# Altium footprint library hallglib.PcbLib: 90 footprints (part 4 of 6)
Each footprint in its own frame and in the unit in brackets; x right, y up, seen from the top. Pads: shape width x height; smd on the part's side, far side on the other; paste and mask are expansions set on the pad; w line width, h text height; cw(c..) or ccw(c..) is an arc to the next point about the centre after c.
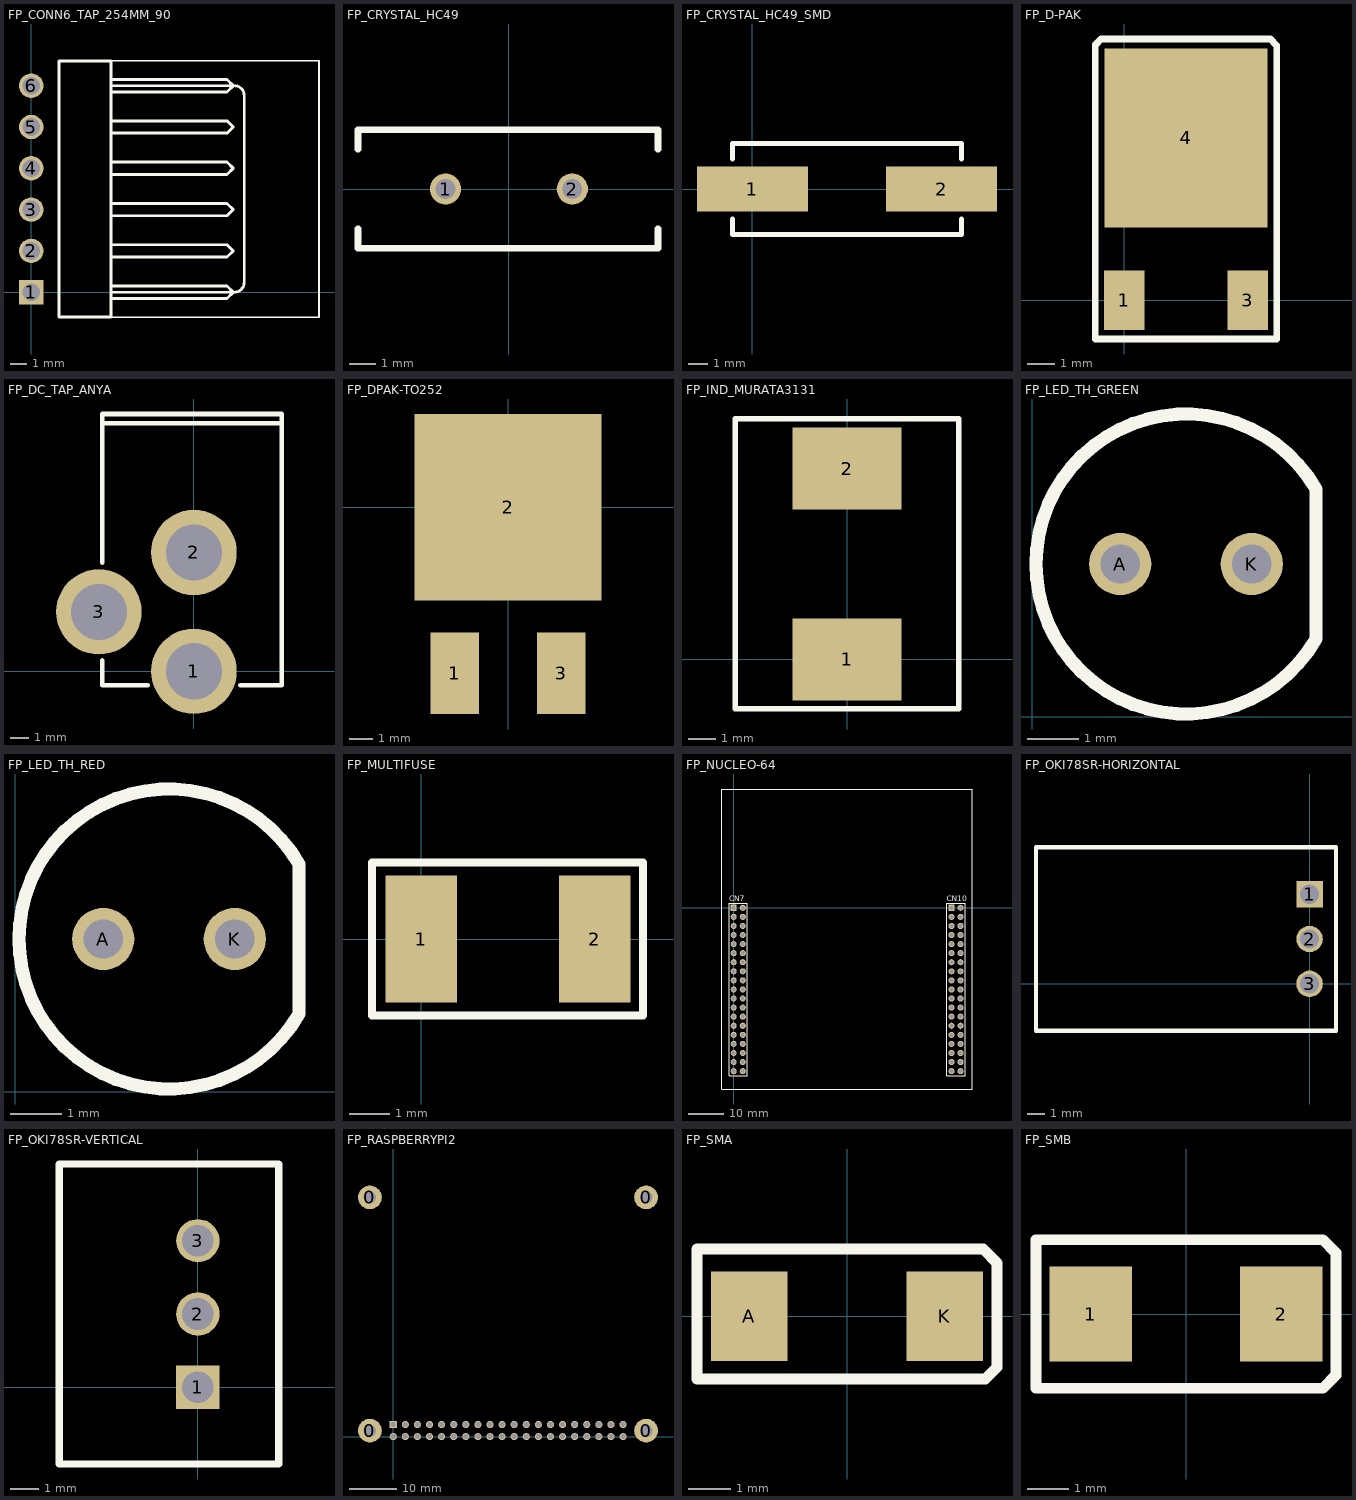
[diagram p3: the footprints below, top view; thin cyan lines are the x and y axes]

## FP_CONN6_TAP_254MM_90 [mm] "fekvő hat pólusú tápcsatlakozó 2.54mm"
height 6.3
pads (6):
  rect 1.5x1.5 hole 1.1: 1(0,0)
  round 1.5 hole 1.1: 2(0,2.54) 3(0,5.08) 4(0,7.62) 5(0,10.16) 6(0,12.7)
Top Overlay:
  lines w0.102: 4.9,-1.53 17.7,-1.53 17.7,14.224 4.9,14.224
  lines w0.178: 4.9,0 12.5,0 ccw(c12.5,0.6) 13.1,0.6 13.1,12.065 ; 4.9,12.7 12.5,12.7 cw(c12.5,12.1) 13.1,12.1 ; 4.934,-0.381 12.046,-0.381 12.427,0 12.046,0.381 4.934,0.381 ; 4.934,2.159 12.046,2.159 12.427,2.54 12.046,2.921 4.934,2.921 ; 4.934,4.699 12.046,4.699 12.427,5.08 12.046,5.461 4.934,5.461 ; 4.934,7.239 12.046,7.239 12.427,7.62 12.046,8.001 4.934,8.001 ; 4.934,9.779 12.046,9.779 12.427,10.16 12.046,10.541 4.934,10.541 ; 4.934,12.319 12.046,12.319 12.427,12.7 12.046,13.081 4.934,13.081 ; 1.7,-1.524 1.7,14.224 4.9,14.224 4.9,-1.524 1.7,-1.524
3D body "254_TAP_4P.STEP": height 5.8, standoff -3.4, extent -0.343,3.785 13.482,13.945
3D body "254_TAP_4P.STEP": height 5.8, standoff -3.4, extent -0.343,-1.295 13.482,8.865

## FP_CRYSTAL_HC49 [mm] "HC49"
height 3.7
pads (2):
  round 1.2 hole 0.762: 1(-2.44,0) 2(2.44,0)
Top Overlay:
  lines w0.254: -5.816,-1.524 -5.816,-2.286 5.741,-2.286 5.741,-1.524 ; -5.816,1.524 -5.816,2.286 5.741,2.286 5.741,1.524
3D body "SW3dPS-HP49US.STEP": height 3.5, standoff -4, extent -5.675,-2.35 5.675,2.3

## FP_CRYSTAL_HC49_SMD [mil] "HC49/SMD"
height 118.11
pads (2):
  rect 220x90 smd: 1(0,0) 2(375,0)
Top Overlay:
  lines w10: -40,-60 -40,-90 415,-90 415,-60 ; -40,60 -40,90 415,90 415,60
3D body: height 130, standoff 10, extent -25,-80 400,80
3D body: height 10, standoff 0, extent -40,-90 415,90
3D body: height 5, standoff 0, extent -57,-20 -40,20
3D body: height 5, standoff 0, extent 415,-20 432,20

## FP_D-PAK [mm] "D-Pak (TO-252-AA)"
height 2.39
pads (3):
  rect 1.5x2.2 smd: 1(0,0) 3(4.572,0)
  rect 6x6.6 smd: 4(2.286,6)
Top Overlay:
  lines w0.254: -1.064,-1.425 5.636,-1.425 5.636,9.414 5.4,9.65 -0.85,9.65 -1.064,9.436 -1.064,-1.425
3D body "D-PAK_TO252AA.STEP": height 2.32, standoff 0.02, extent -0.992,-0.786 5.588,8.914

## FP_DC_TAP_ANYA [mil] "DC HEBA25 TÁPFESZÜLTSÉG ALJZAT ZÁRT, NYÁKBA 90°"
height 421.26
pads (3):
  round 180 hole 118: 1(0,0) 2(0,250) 3(-200,125)
Top Overlay:
  lines w10: -192.91,22.64 -192.91,-29.53 -97.44,-29.53 ; -192.91,228.35 -192.91,541.34 185.04,541.34 185.04,-29.53 97.44,-29.53 ; -192.91,522.13 185.04,522.13
3D body "kycon kld-0202-a.step": height 440, standoff -141.73, extent -190.39,-30.63 182.52,539.37

## FP_DPAK-TO252 [mm] "D-PAK Package"
height 2.18
pads (3):
  rect 2.08x3.5 smd: 1(-2.286,-7.112) 3(2.286,-7.112)
  rect 8x8 smd: 2(0,0)
3D body "DPAK_TO-252AA.STEP": height 2.37, standoff -0.03, extent -3.367,-7.112 3.367,2.988

## FP_IND_MURATA3131 [mm] "Murata Chip Inductor LQH88P Series (3131 Size)"
height 4
pads (2):
  rect 4x3 smd: 1(0,0) 2(0,7)
Top Overlay:
  lines w0.2: -4.1,-1.8 -4.1,8.825 4.1,8.825 4.1,-1.8 -4.1,-1.8
3D body: height 1, standoff 0, extent -4,-0.5 4,7.6
3D body: height 3.8, standoff 2.8, extent -4,-0.5 4,7.6
3D body: height 2.8, standoff 1, extent -3.572,-0.043 3.6,7.143
3D body: height 0.3, standoff 0, extent -1.4,-0.55 1.4,-0.5
3D body: height 0.3, standoff 0, extent -1.4,7.6 1.4,7.65

## FP_LED_TH_GREEN [mm]
pads (2):
  round 1.2 hole 0.762: A(1.7,2.95) K(4.24,2.95)
Top Overlay:
  lines w0.254: 5.478,1.502 cw(c2.97,2.95) 5.478,4.398 5.478,1.502
3D body "corto_green.step": height 10.25, standoff -5, extent 0,0 5.45,5.9

## FP_LED_TH_RED [mm]
pads (2):
  round 1.2 hole 0.762: A(1.7,2.95) K(4.24,2.95)
Top Overlay:
  lines w0.254: 5.478,1.502 cw(c2.97,2.95) 5.478,4.398 5.478,1.502
3D body "corto_red.step": height 10.25, standoff -5, extent 0,0 5.45,5.9

## FP_MULTIFUSE [mm] "POLYFUSE SMD 1812"
height 1
pads (2):
  rect 1.78x3.15 smd: 1(0,0) 2(4.318,0)
Top Overlay:
  lines w0.2: -1.225,-1.9 5.525,-1.9 5.525,1.9 -1.225,1.9 -1.225,-1.9
3D body: height 1, standoff 0, extent -0.124,-1.714 4.574,1.714

## FP_NUCLEO-64 [mm]
height 11
pads (76):
  rect 1.7x1.7 hole 1.1: 1(0,0) 39(60.96,0)
  round 1.7 hole 1.1: 2(2.54,0) 3(0,-2.54) 4(2.54,-2.54) 5(0,-5.08) 6(2.54,-5.08) 7(0,-7.62) 8(2.54,-7.62) 9(0,-10.16) 10(2.54,-10.16) 11(0,-12.7) 12(2.54,-12.7) 13(0,-15.24) 14(2.54,-15.24) 15(0,-17.78) 16(2.54,-17.78) 17(0,-20.32) 18(2.54,-20.32) 19(0,-22.86) 20(2.54,-22.86) 21(0,-25.4) 22(2.54,-25.4) 23(0,-27.94) 24(2.54,-27.94) 25(0,-30.48) 26(2.54,-30.48) 27(0,-33.02) 28(2.54,-33.02) 29(0,-35.56) 30(2.54,-35.56) 31(0,-38.1) 32(2.54,-38.1) 33(0,-40.64) 34(2.54,-40.64) 35(0,-43.18) 36(2.54,-43.18) 37(0,-45.72) 38(2.54,-45.72) 40(63.5,0) 41(60.96,-2.54) 42(63.5,-2.54) 43(60.96,-5.08) 44(63.5,-5.08) 45(60.96,-7.62) 46(63.5,-7.62) 47(60.96,-10.16) 48(63.5,-10.16) 49(60.96,-12.7) 50(63.5,-12.7) 51(60.96,-15.24) 52(63.5,-15.24) 53(60.96,-17.78) 54(63.5,-17.78) 55(60.96,-20.32) 56(63.5,-20.32) 57(60.96,-22.86) 58(63.5,-22.86) 59(60.96,-25.4) 60(63.5,-25.4) 61(60.96,-27.94) 62(63.5,-27.94) 63(60.96,-30.48) 64(63.5,-30.48) 65(60.96,-33.02) 66(63.5,-33.02) 67(60.96,-35.56) 68(63.5,-35.56) 69(60.96,-38.1) 70(63.5,-38.1) 71(60.96,-40.64) 72(63.5,-40.64) 73(60.96,-43.18) 74(63.5,-43.18) 75(60.96,-45.72) 76(63.5,-45.72)
Top Overlay:
  lines w0.2: -1.27,-46.99 3.81,-46.99 3.81,1.27 -1.27,1.27 -1.27,-46.99 ; 59.69,-46.99 64.77,-46.99 64.77,1.27 59.69,1.27 59.69,-46.99
  lines w0.254: -3.3,-50.725 -3.3,33.25 66.725,33.25 66.725,-50.725 -3.3,-50.725
  text "CN10" at 59.69,1.778 h1.52
  text "CN7" at -1.27,1.778 h1.52
3D body: height 10, standoff 0, extent 59.691,-46.989 64.769,1.269
3D body: height 10, standoff 0, extent -1.269,-46.989 3.809,1.269
3D body: height 11, standoff 10, extent -3.299,-50.724 66.724,33.249

## FP_OKI78SR-HORIZONTAL [mm] "OKI regulator"
height 8.6
pads (3):
  rect 1.5x1.5 hole 1.1: 1(0,5.08)
  round 1.5 hole 1.1: 2(0,2.54) 3(0,0)
Top Overlay:
  lines w0.254: -15.5,-2.66 1.5,-2.66 1.5,7.74 -15.5,7.74 -15.5,-2.66
3D body "mps_dcdc_oki_78sr_horiz_a.step": height 7.67, standoff -5.26, extent -15.235,-2.621 1.275,7.793

## FP_OKI78SR-VERTICAL [mm] "OKI regulator"
height 16.5
pads (3):
  rect 1.5x1.5 hole 1.1: 1(0,0)
  round 1.5 hole 1.1: 2(0,2.54) 3(0,5.08)
Top Overlay:
  lines w0.254: -4.8,-2.66 -4.8,7.74 2.8,7.74 2.8,-2.66 -4.8,-2.66
3D body "mps_dcdc_oki_78sr_a.step": height 16.52, standoff -3.29, extent -4.875,-2.667 2.859,7.747

## FP_RASPBERRYPI2 [mm] "Raspberry Pi 2"
pads (44):
  round 5 hole 2.6: 0(-4.9,1.25) 0(-4.9,50.25) 0(53.1,1.25) 0(53.1,50.25)
  rect 1.5x1.5 hole 1.1: 1(0,2.54)
  round 1.5 hole 1.1: 2(0,0) 3(2.54,2.54) 4(2.54,0) 5(5.08,2.54) 6(5.08,0) 7(7.62,2.54) 8(7.62,0) 9(10.16,2.54) 10(10.16,0) 11(12.7,2.54) 12(12.7,0) 13(15.24,2.54) 14(15.24,0) 15(17.78,2.54) 16(17.78,0) 17(20.32,2.54) 18(20.32,0) 19(22.86,2.54) 20(22.86,0) 21(25.4,2.54) 22(25.4,0) 23(27.94,2.54) 24(27.94,0) 25(30.48,2.54) 26(30.48,0) 27(33.02,2.54) 28(33.02,0) 29(35.56,2.54) 30(35.56,0) 31(38.1,2.54) 32(38.1,0) 33(40.64,2.54) 34(40.64,0) 35(43.18,2.54) 36(43.18,0) 37(45.72,2.54) 38(45.72,0) 39(48.26,2.54) 40(48.26,0)
3D body "Raspberry_Pi_Model_B+_3D_Assy.STEP": height 13.87, standoff -5.53, extent -8.001,-2.413 79.149,56.087
3D body: height 9, standoff 0, extent -1.27,-1.27 50.165,3.81
3D body: height 0, standoff -3.2, extent -0.325,2.34 0.325,2.74
3D body: height 0, standoff -3.2, extent 2.215,2.34 2.865,2.74
3D body: height 0, standoff -3.2, extent 4.755,2.34 5.405,2.74
3D body: height 0, standoff -3.2, extent 7.295,2.34 7.945,2.74
3D body: height 0, standoff -3.2, extent 9.835,2.34 10.485,2.74
3D body: height 0, standoff -3.2, extent 12.375,2.34 13.025,2.74
3D body: height 0, standoff -3.2, extent 14.915,2.34 15.565,2.74
3D body: height 0, standoff -3.2, extent 17.455,2.34 18.105,2.74
3D body: height 0, standoff -3.2, extent 19.995,2.34 20.645,2.74
3D body: height 0, standoff -3.2, extent 22.535,2.34 23.185,2.74
3D body: height 0, standoff -3.2, extent 25.075,2.34 25.725,2.74
3D body: height 0, standoff -3.2, extent 27.615,2.34 28.265,2.74
3D body: height 0, standoff -3.2, extent 30.155,2.34 30.805,2.74
3D body: height 0, standoff -3.2, extent 32.695,2.34 33.345,2.74
3D body: height 0, standoff -3.2, extent 35.235,2.34 35.885,2.74
3D body: height 0, standoff -3.2, extent 37.775,2.34 38.425,2.74
3D body: height 0, standoff -3.2, extent 40.315,2.34 40.965,2.74
3D body: height 0, standoff -3.2, extent 42.855,2.34 43.505,2.74
3D body: height 0, standoff -3.2, extent 45.395,2.34 46.045,2.74
3D body: height 0, standoff -3.2, extent 47.935,2.34 48.585,2.74
3D body: height 0, standoff -3.2, extent -0.325,-0.2 0.325,0.2
3D body: height 0, standoff -3.2, extent 2.215,-0.2 2.865,0.2
3D body: height 0, standoff -3.2, extent 4.755,-0.2 5.405,0.2
3D body: height 0, standoff -3.2, extent 7.295,-0.2 7.945,0.2
3D body: height 0, standoff -3.2, extent 9.835,-0.2 10.485,0.2
3D body: height 0, standoff -3.2, extent 12.375,-0.2 13.025,0.2
3D body: height 0, standoff -3.2, extent 14.915,-0.2 15.565,0.2
3D body: height 0, standoff -3.2, extent 17.455,-0.2 18.105,0.2
3D body: height 0, standoff -3.2, extent 19.995,-0.2 20.645,0.2
3D body: height 0, standoff -3.2, extent 22.535,-0.2 23.185,0.2
3D body: height 0, standoff -3.2, extent 25.075,-0.2 25.725,0.2
3D body: height 0, standoff -3.2, extent 27.615,-0.2 28.265,0.2
3D body: height 0, standoff -3.2, extent 30.155,-0.2 30.805,0.2
3D body: height 0, standoff -3.2, extent 32.695,-0.2 33.345,0.2
3D body: height 0, standoff -3.2, extent 35.235,-0.2 35.885,0.2
3D body: height 0, standoff -3.2, extent 37.775,-0.2 38.425,0.2
3D body: height 0, standoff -3.2, extent 40.315,-0.2 40.965,0.2
3D body: height 0, standoff -3.2, extent 42.855,-0.2 43.505,0.2
3D body: height 0, standoff -3.2, extent 45.395,-0.2 46.045,0.2
3D body: height 0, standoff -3.2, extent 47.935,-0.2 48.585,0.2

## FP_SMA [mm] "SMA footprint"
height 2
pads (2):
  rect 1.8x2.1 smd: A(-2.3,0) K(2.3,0)
Top Overlay:
  lines w0.254: -3.525,-1.475 3.25,-1.475 3.525,-1.2 3.525,1.25 3.2,1.575 -3.525,1.575 -3.525,-1.475
3D body "User Library-S1G-1.STEP": height 2.7, standoff 0, extent -2.8,-1.475 2.8,1.475

## FP_SMB [mm] "DO214-AA tok (SMB)"
height 2.5
pads (2):
  rect 2x2.3 smd: 1(-2.3,0) 2(2.3,0)
Top Overlay:
  lines w0.254: -3.625,-1.8 -3.625,1.8 3.3,1.8 3.625,1.475 3.625,-1.475 3.3,-1.8 -3.625,-1.8
3D body "DO-214AA SMB.STEP": height 2.32, standoff 0.02, extent -2.7,-1.8 2.7,1.8